# Altium footprint library Selex_PCBLib.PcbLib: 388 footprints (part 23 of 25)
Each footprint in its own frame and in the unit in brackets; x right, y up, seen from the top. Pads: shape width x height; smd on the part's side, far side on the other; paste and mask are expansions set on the pad; w line width, h text height; cw(c..) or ccw(c..) is an arc to the next point about the centre after c.
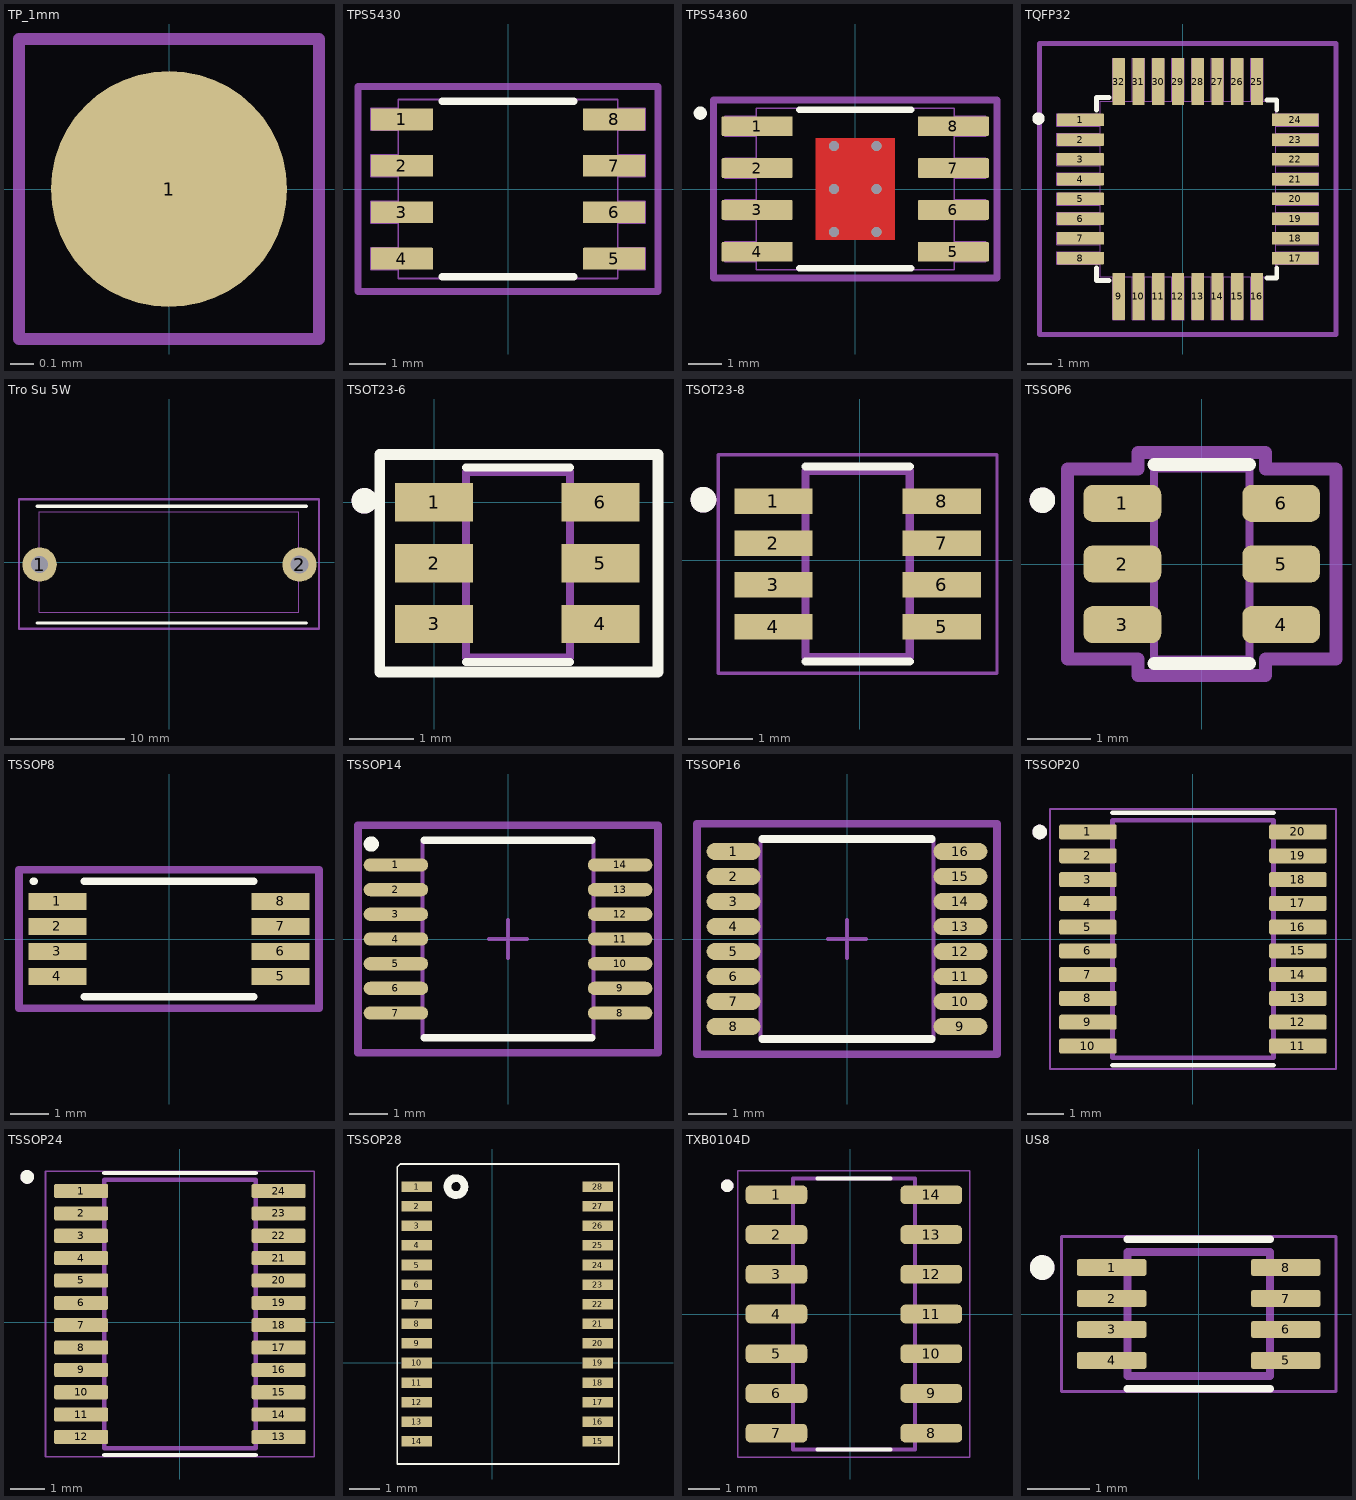
[diagram p22: the footprints below, top view; thin cyan lines are the x and y axes]

## TP_1mm [mm] "Surface"
pads (1):
  round 1 smd: 1(0,0)
Mechanical 15:
  lines w0.05: -0.635,-0.635 -0.635,0.635 0.635,0.635 0.635,-0.635 -0.635,-0.635

## TPS5430 [mm]
pads (8):
  rrect10% 1.7x0.6 smd mask+0.05: 1(-2.9,1.905) 2(-2.9,0.635) 3(-2.9,-0.635) 4(-2.9,-1.905) 5(2.9,-1.905) 6(2.9,-0.635) 7(2.9,0.635) 8(2.9,1.905)
Top Overlay:
  lines w0.2: -1.8,-2.4 1.8,-2.4 ; -1.8,2.4 1.8,2.4
Mechanical 1:
  lines w0.05: -3,-2.205 -3.75,-2.205 -3.75,-1.605 -3,-1.605 ; -3,-0.935 -3.75,-0.935 -3.75,-0.335 -3,-0.335 ; -3,0.335 -3.75,0.335 -3.75,0.935 -3,0.935 ; -3,1.605 -3.75,1.605 -3.75,2.205 -3,2.205 ; 3,-2.205 3.75,-2.205 3.75,-1.605 3,-1.605 ; 3,-0.935 3.75,-0.935 3.75,-0.335 3,-0.335 ; 3,0.335 3.75,0.335 3.75,0.935 3,0.935 ; 3,1.605 3.75,1.605 3.75,2.205 3,2.205 ; -3,-2.45 -3,2.45 3,2.45 3,-2.45 -3,-2.45
Mechanical 15:
  lines w0.2: -4.1,-2.8 4.1,-2.8 4.1,2.8 -4.1,2.8 -4.1,-2.8
3D body "User Library-SOP8_150mil_3_8mm_Body.step": height 1.6, standoff 0, extent -1.95,-2.45 1.95,2.45
3D body: height 0.25, standoff 0, extent -3,2.405 -3,2.405
3D body: height 0.25, standoff 0, extent -0.8,0.605 -0.8,0.605

## TPS54360 [mm] "DC - DC, INPUT: 4.5-60v, OUTPUT: 0.8-58.8v. 3A"
height 1.7
pads (8):
  rrect10% 2.15x0.6 smd mask+0.05: 1(-2.975,1.905) 2(-2.975,0.635) 3(-2.975,-0.635) 4(-2.975,-1.905) 5(2.975,-1.905) 6(2.975,-0.635) 7(2.975,0.635) 8(2.975,1.905)
via 0.65,-1.3 diameter 0.3 hole 0.3
via -0.65,-1.3 diameter 0.3 hole 0.3
via -0.65,0 diameter 0.3 hole 0.3
via -0.65,1.3 diameter 0.3 hole 0.3
via 0.65,1.3 diameter 0.3 hole 0.3
via 0.65,0 diameter 0.3 hole 0.3
Top Layer:
  rectangle: -1.2,-1.55 1.2,1.55
Top Overlay:
  circle w0.2: c-4.7,2.3 r0.1
  lines w0.2: -1.7,-2.4 1.7,-2.4 ; -1.7,2.4 1.7,2.4
Mechanical 1:
  lines w0.05: -3,-2.205 -3.95,-2.205 -3.95,-1.605 -3,-1.605 ; -3,-0.935 -3.95,-0.935 -3.95,-0.335 -3,-0.335 ; -3,0.335 -3.95,0.335 -3.95,0.935 -3,0.935 ; -3,1.605 -3.95,1.605 -3.95,2.205 -3,2.205 ; 3,-2.205 3.95,-2.205 3.95,-1.605 3,-1.605 ; 3,-0.935 3.95,-0.935 3.95,-0.335 3,-0.335 ; 3,0.335 3.95,0.335 3.95,0.935 3,0.935 ; 3,1.605 3.95,1.605 3.95,2.205 3,2.205 ; -3,-2.45 -3,2.45 3,2.45 3,-2.45 -3,-2.45
Mechanical 15:
  lines w0.2: -4.3,-2.7 -4.3,2.7 4.3,2.7 4.3,-2.7 -4.3,-2.7
3D body "User Library-TPS54360DDA.step": height 1.78, standoff 0.19, extent -3.1,-2.5 3.1,2.5

## TQFP32 [mm] "Thin QFP, 32-Leads, Body 9x9mm, Pitch 0.8mm, IPC Low Density"
height 1.6
pads (32):
  rrect10% 1.9x0.5 smd mask+0.05: 1(-4.15,2.8) 2(-4.15,2) 3(-4.15,1.2) 4(-4.15,0.4) 5(-4.15,-0.4) 6(-4.15,-1.2) 7(-4.15,-2) 8(-4.15,-2.8) 17(4.55,-2.8) 18(4.55,-2) 19(4.55,-1.2) 20(4.55,-0.4) 21(4.55,0.4) 22(4.55,1.2) 23(4.55,2) 24(4.55,2.8)
  rrect10% 0.5x1.9 smd mask+0.05: 9(-2.6,-4.35) 10(-1.8,-4.35) 11(-1,-4.35) 12(-0.2,-4.35) 13(0.6,-4.35) 14(1.4,-4.35) 15(2.2,-4.35) 16(3,-4.35) 25(3,4.35) 26(2.2,4.35) 27(1.4,4.35) 28(0.6,4.35) 29(-0.2,4.35) 30(-1,4.35) 31(-1.8,4.35) 32(-2.6,4.35)
Top Overlay:
  circle w0.3: c-5.85,2.85 r0.1
  lines w0.2: -3.5,-3.2 -3.5,-3.7 -3,-3.7 ; -3.5,3.2 -3.5,3.7 -3,3.7 ; 3.4,-3.6 3.8,-3.6 3.8,-3.2 ; 3.4,3.6 3.8,3.6 3.8,3.2
Mechanical 1:
  lines w0.05: -5.1,2.55 -5.1,3.05 ; -5.1,2.55 -3.35,2.55 ; -5.1,2.55 -3.35,2.55 ; -5.1,2.55 -5.1,3.05 ; -5.1,3.05 -3.35,3.05 ; -5.1,3.05 -3.35,3.05 ; -3.35,2.55 -3.35,3.05 ; -3.35,2.55 -3.35,3.05 ; -2.85,-5.3 -2.35,-5.3 ; -2.85,-5.3 -2.85,-3.55 ; -2.85,-5.3 -2.85,-3.55 ; -2.85,-5.3 -2.35,-5.3 ; -2.85,-3.55 -2.35,-3.55 ; -2.85,-3.55 -2.35,-3.55 ; -2.35,-5.3 -2.35,-3.55 ; -2.35,-5.3 -2.35,-3.55 ; 2.75,3.55 2.75,5.3 ; 2.75,3.55 3.25,3.55 ; 2.75,3.55 3.25,3.55 ; 2.75,3.55 2.75,5.3 ; 2.75,5.3 3.25,5.3 ; 2.75,5.3 3.25,5.3 ; 3.25,3.55 3.25,5.3 ; 3.25,3.55 3.25,5.3 ; 3.75,-3.05 3.75,-2.55 ; 3.75,-3.05 5.5,-3.05 ; 3.75,-3.05 5.5,-3.05 ; 3.75,-3.05 3.75,-2.55 ; 3.75,-2.55 5.5,-2.55 ; 3.75,-2.55 5.5,-2.55 ; 5.5,-3.05 5.5,-2.55 ; 5.5,-3.05 5.5,-2.55 ; -5.1,-3.05 -5.1,-2.55 -3.35,-2.55 -3.35,-3.05 -5.1,-3.05 ; -5.1,-2.25 -5.1,-1.75 -3.35,-1.75 -3.35,-2.25 -5.1,-2.25 ; -5.1,-1.45 -5.1,-0.95 -3.35,-0.95 -3.35,-1.45 -5.1,-1.45 ; -5.1,-0.65 -5.1,-0.15 -3.35,-0.15 -3.35,-0.65 -5.1,-0.65 ; -5.1,0.15 -5.1,0.65 -3.35,0.65 -3.35,0.15 -5.1,0.15 ; -5.1,0.95 -5.1,1.45 -3.35,1.45 -3.35,0.95 -5.1,0.95 ; -5.1,1.75 -5.1,2.25 -3.35,2.25 -3.35,1.75 -5.1,1.75 ; -3.35,-3.55 3.75,-3.55 3.75,3.55 -3.35,3.55 -3.35,-3.55 ; -2.85,3.55 -2.35,3.55 -2.35,5.3 -2.85,5.3 -2.85,3.55 ; -2.05,-5.3 -2.05,-3.55 -1.55,-3.55 -1.55,-5.3 -2.05,-5.3 ; -2.05,3.55 -1.55,3.55 -1.55,5.3 -2.05,5.3 -2.05,3.55 ; -1.25,-5.3 -1.25,-3.55 -0.75,-3.55 -0.75,-5.3 -1.25,-5.3 ; -1.25,3.55 -0.75,3.55 -0.75,5.3 -1.25,5.3 -1.25,3.55 ; -0.45,-5.3 -0.45,-3.55 0.05,-3.55 0.05,-5.3 -0.45,-5.3 ; -0.45,3.55 0.05,3.55 0.05,5.3 -0.45,5.3 -0.45,3.55 ; 0.35,-5.3 0.35,-3.55 0.85,-3.55 0.85,-5.3 0.35,-5.3 ; 0.35,3.55 0.85,3.55 0.85,5.3 0.35,5.3 0.35,3.55 ; 1.15,-5.3 1.15,-3.55 1.65,-3.55 1.65,-5.3 1.15,-5.3 ; 1.15,3.55 1.65,3.55 1.65,5.3 1.15,5.3 1.15,3.55 ; 1.95,-5.3 1.95,-3.55 2.45,-3.55 2.45,-5.3 1.95,-5.3 ; 1.95,3.55 2.45,3.55 2.45,5.3 1.95,5.3 1.95,3.55 ; 2.75,-5.3 2.75,-3.55 3.25,-3.55 3.25,-5.3 2.75,-5.3 ; 3.75,-2.25 5.5,-2.25 5.5,-1.75 3.75,-1.75 3.75,-2.25 ; 3.75,-1.45 5.5,-1.45 5.5,-0.95 3.75,-0.95 3.75,-1.45 ; 3.75,-0.65 5.5,-0.65 5.5,-0.15 3.75,-0.15 3.75,-0.65 ; 3.75,0.15 5.5,0.15 5.5,0.65 3.75,0.65 3.75,0.15 ; 3.75,0.95 5.5,0.95 5.5,1.45 3.75,1.45 3.75,0.95 ; 3.75,1.75 5.5,1.75 5.5,2.25 3.75,2.25 3.75,1.75 ; 3.75,2.55 5.5,2.55 5.5,3.05 3.75,3.05 3.75,2.55
Mechanical 15:
  lines w0.2: -5.8,-5.9 6.2,-5.9 6.2,5.9 -5.8,5.9 -5.8,-5.9
3D body "User Library-SW3dPS-atmega8 (tqfp32)_V2008.step": height 1.1, standoff -0.01, extent -4.6,-4.85 5,4.75

## Tro Su 5W [mm]
pads (2):
  round 3 hole 1.5 mask+0.1: 1(-11.3,-0.2)
  round 3 hole 1.6 mask+0.1: 2(11.4,-0.2)
Top Overlay:
  lines w0.3: -11.5,-5.3 12,-5.3 ; -11.5,4.9 12,4.9
Mechanical 1:
  lines w0.05: -11.35,-4.38 11.35,-4.38 11.35,4.42 -11.35,4.42 -11.35,-4.38
Mechanical 15:
  lines w0.2: -13.1,-5.8 -13.1,5.5 13.1,5.5 13.1,-5.8 -2.4,-5.8 -13.1,-5.8
3D body "696107003002.STEP": height 14, standoff -3, extent -12.2,-4.88 12.2,4.52

## TSOT23-6 [mm]
pads (6):
  rect 1.22x0.6 smd: 1(0,0) 2(0,-0.95) 3(0,-1.9) 4(2.6,-1.9) 5(2.6,-0.95) 6(2.6,0)
Top Overlay:
  circle w0.2: c-1.09,0.025 r0.1
  lines w0.127: 0.497,-2.495 2.123,-2.495 ; 0.497,0.545 2.123,0.545
  lines w0.167: -0.85,-2.65 -0.85,0.75 3.5,0.75 3.5,-2.65 -0.85,-2.65
Mechanical 13:
  circle w0.2: c-1.09,0.025 r0.1
  lines w0.127: 0.497,-2.425 0.497,0.475 2.123,0.475 2.123,-2.425 0.497,-2.425
Mechanical 15:
  lines w0.05: -0.86,-2.675 3.48,-2.675 3.48,0.725 -0.86,0.725 -0.86,-2.675
3D body "User Library-TSOT-23-6(S6).STEP": height 1, standoff 0, extent -0.062,-2.45 2.762,0.45

## TSOT23-8 [mm]
pads (8):
  rect 1.22x0.4 smd: 1(-1.343,0.918) 2(-1.343,0.268) 3(-1.343,-0.382) 4(-1.343,-1.032) 5(1.277,-1.032) 6(1.277,-0.382) 7(1.277,0.268) 8(1.277,0.918)
Top Overlay:
  circle w0.2: c-2.433,0.943 r0.1
  lines w0.127: -0.845,-1.577 0.78,-1.577 ; -0.845,1.463 0.78,1.463
Mechanical 13:
  circle w0.2: c-2.433,0.943 r0.1
  lines w0.127: -0.845,-1.507 0.78,-1.507 0.78,1.393 -0.845,1.393 -0.845,-1.507
Mechanical 15:
  lines w0.05: -2.203,-1.757 -2.203,1.643 2.137,1.643 2.137,-1.757 -2.203,-1.757

## TSSOP6 [mm] "TSSOP_6_0P95_2P65"
pads (6):
  rrect50% 1.22x0.58 smd: 1(-1.245,0.95) 2(-1.245,0) 3(-1.245,-0.95) 4(1.245,-0.95) 5(1.245,0) 6(1.245,0.95)
Top Overlay:
  circle w0.2: c-2.5,1 r0.1
  lines w0.2: -0.75,-1.56 0.75,-1.56 ; -0.75,1.56 0.75,1.56
Mechanical 13:
  circle w0.2: c-2.5,1 r0.1
  lines w0.127: -0.75,-1.5 -0.75,1.5 0.75,1.5 0.75,-1.5 -0.75,-1.5
Mechanical 15:
  lines w0.2: -2.105,-1.49 -1,-1.49 -1,-1.75 1,-1.75 1,-1.49 2.105,-1.49 2.105,1.49 1,1.49 1,1.75 -1,1.75 -1,1.49 -2.105,1.49 -2.105,-1.49
3D body "NUP4114HMR6T1G.STEP": height 1.1, standoff 0, extent -1.375,-1.5 1.375,1.5

## TSSOP8 [mm] "TSSOP_8_0p65_5p8"
pads (8):
  rect 1.5x0.45 smd paste+0.1: 1(-2.9,0.975) 2(-2.9,0.325) 3(-2.9,-0.325) 4(-2.9,-0.975) 5(2.9,-0.975) 6(2.9,-0.325) 7(2.9,0.325) 8(2.9,0.975)
Top Overlay:
  lines w0.2: -3.525,1.5 -3.5,1.5 ; -2.2,-1.5 2.2,-1.5 ; -2.2,1.5 2.2,1.5
Mechanical 15:
  lines w0.2: -3.9,-1.8 -3.9,1.8 -0.5,1.8 3.9,1.8 3.9,-1.8 -3.9,-1.8
3D body "User Library-TSS0P8.STEP": height 1.09, standoff 0, extent -3.14,-1.525 3.14,1.475

## TSSOP14 [mm] "TSSOP_14_0p65x5p9"
pads (14):
  oval 1.7x0.35 smd: 1(-2.952,1.95) 2(-2.952,1.3) 3(-2.952,0.65) 4(-2.952,0) 5(-2.952,-0.65) 6(-2.952,-1.3) 7(-2.952,-1.95) 8(2.952,-1.95) 9(2.952,-1.3) 10(2.952,-0.65) 11(2.952,0) 12(2.952,0.65) 13(2.952,1.3) 14(2.952,1.95)
Top Overlay:
  circle w0.2: c-3.6,2.5 r0.1
  lines w0.2: -2.2,-2.6 2.2,-2.6 ; -2.2,2.6 2.2,2.6
Mechanical 13:
  lines w0.1: -2.25,-2.55 -2.25,2.55 2.25,2.55 2.25,-2.55 -2.25,-2.55
Mechanical 15:
  lines w0.1: -0.5,0 0.5,0 ; 0,-0.5 0,0.5
  lines w0.2: -3.95,-3 -3.95,3 3.95,3 3.95,-3 -3.95,-3
3D body "PW14.stp": height 1.2, standoff 0, extent -3.302,-2.553 3.302,2.553

## TSSOP16 [mm] "TSSOP_16_0P65_6P0"
pads (16):
  oval 1.4x0.45 smd: 1(-2.95,2.275) 2(-2.95,1.625) 3(-2.95,0.975) 4(-2.95,0.325) 5(-2.95,-0.325) 6(-2.95,-0.975) 7(-2.95,-1.625) 8(-2.95,-2.275) 9(2.95,-2.275) 10(2.95,-1.625) 11(2.95,-0.975) 12(2.95,-0.325) 13(2.95,0.325) 14(2.95,0.975) 15(2.95,1.625) 16(2.95,2.275)
Top Overlay:
  lines w0.2: -2.2,-2.6 2.2,-2.6 ; -2.2,2.6 2.2,2.6
Mechanical 13:
  lines w0.1: -2.25,-2.55 -2.25,2.55 2.25,2.55 2.25,-2.55 -2.25,-2.55
Mechanical 15:
  lines w0.1: -0.5,0 0.5,0 ; 0,-0.5 0,0.5
  lines w0.2: -3.9,-3 -3.9,3 3.9,3 3.9,-3 -3.9,-3
3D body "User Library-TSSOP-16-1.STEP": height 1.1, standoff 0, extent -3.2,-2.5 3.2,2.5

## TSSOP20 [mm]
pads (20):
  rrect25% 1.57x0.41 smd: 1(-2.87,2.925) 2(-2.87,2.275) 3(-2.87,1.625) 4(-2.87,0.975) 5(-2.87,0.325) 6(-2.87,-0.325) 7(-2.87,-0.975) 8(-2.87,-1.625) 9(-2.87,-2.275) 10(-2.87,-2.925) 11(2.87,-2.925) 12(2.87,-2.275) 13(2.87,-1.625) 14(2.87,-0.975) 15(2.87,-0.325) 16(2.87,0.325) 17(2.87,0.975) 18(2.87,1.625) 19(2.87,2.275) 20(2.87,2.925)
Top Overlay:
  circle w0.2: c-4.19,2.925 r0.1
  lines w0.127: -2.2,-3.45 2.2,-3.45 ; -2.2,3.45 2.2,3.45
Mechanical 13:
  circle w0.2: c-4.19,2.925 r0.1
  lines w0.127: -2.2,-3.25 -2.2,3.25 2.2,3.25 2.2,-3.25 -2.2,-3.25
Mechanical 15:
  lines w0.05: -3.91,-3.55 -3.91,3.55 3.91,3.55 3.91,-3.55 -3.91,-3.55
3D body "stm8s003f3p6.stp": height 1.1, standoff 0, extent -3.15,-3.3 3.25,3.2

## TSSOP24 [mm]
pads (24):
  rrect25% 1.57x0.41 smd: 1(-2.858,3.812) 2(-2.858,3.162) 3(-2.858,2.512) 4(-2.858,1.862) 5(-2.858,1.212) 6(-2.858,0.562) 7(-2.858,-0.088) 8(-2.858,-0.738) 9(-2.858,-1.388) 10(-2.858,-2.038) 11(-2.858,-2.688) 12(-2.858,-3.338) 13(2.882,-3.338) 14(2.882,-2.688) 15(2.882,-2.038) 16(2.882,-1.388) 17(2.882,-0.738) 18(2.882,-0.088) 19(2.882,0.562) 20(2.882,1.212) 21(2.882,1.862) 22(2.882,2.512) 23(2.882,3.162) 24(2.882,3.812)
Top Overlay:
  circle w0.2: c-4.428,4.222 r0.1
  lines w0.127: -2.188,-3.863 2.212,-3.863 ; -2.188,4.337 2.212,4.337
Mechanical 13:
  circle w0.2: c-4.428,4.222 r0.1
  lines w0.127: -2.188,-3.663 -2.188,4.137 2.212,4.137 2.212,-3.663 -2.188,-3.663
Mechanical 15:
  lines w0.05: -3.893,-3.913 -3.893,4.387 3.917,4.387 3.917,-3.913 -3.893,-3.913
3D body "step_temp.STEP": height 1.2, standoff 0, extent -3.315,-3.663 3.085,4.137

## TSSOP28 [mm] "TSSOP_8_0p65_5p8"
pads (28):
  rect 1x0.35 smd paste+0.1: 1(-2.5,5.85) 2(-2.5,5.2) 3(-2.5,4.55) 4(-2.5,3.9) 5(-2.5,3.25) 6(-2.5,2.6) 7(-2.5,1.95) 8(-2.5,1.3) 9(-2.5,0.65) 10(-2.5,0) 11(-2.5,-0.65) 12(-2.5,-1.3) 13(-2.5,-1.95) 14(-2.5,-2.6) 15(3.5,-2.6) 16(3.5,-1.95) 17(3.5,-1.3) 18(3.5,-0.65) 19(3.5,0) 20(3.5,0.65) 21(3.5,1.3) 22(3.5,1.95) 23(3.5,2.6) 24(3.5,3.25) 25(3.5,3.9) 26(3.5,4.55) 27(3.5,5.2) 28(3.5,5.85)
Top Overlay:
  circle w0.254: c-1.2,5.85 r0.281
  lines w0.05: -3.15,-3.35 -3.15,6.5 -3.05,6.6 -2.8,6.6 4.2,6.6 4.2,-3.35 -3.15,-3.35
3D body "User Library-TSSOP-28_P065.STEP": height 1.02, standoff 0.03, extent -2.75,-3.2 3.65,6.5

## TXB0104D [mm] "TXB0104D"
pads (14):
  rrect50% 1.97x0.6 smd: 1(-2.356,3.815) 2(-2.356,2.545) 3(-2.356,1.275) 4(-2.356,0.005) 5(-2.356,-1.265) 6(-2.356,-2.535) 7(-2.356,-3.805) 8(2.594,-3.805) 9(2.594,-2.535) 10(2.594,-1.265) 11(2.594,0.005) 12(2.594,1.275) 13(2.594,2.545) 14(2.594,3.815)
Top Overlay:
  circle w0.2: c-3.931,4.105 r0.1
  lines w0.127: -1.051,-4.32 1.289,-4.32 ; -1.051,4.33 1.289,4.33
Mechanical 13:
  circle w0.2: c-3.931,4.105 r0.1
  lines w0.127: -1.831,-4.32 2.069,-4.32 2.069,4.33 -1.831,4.33 -1.831,-4.32
Mechanical 15:
  lines w0.05: -3.591,-4.57 3.829,-4.57 3.829,4.58 -3.591,4.58 -3.591,-4.57
3D body "TXB0104D.STEP": height 1.75, standoff 0, extent -2.881,-4.32 3.119,4.33

## US8 [mm]
pads (8):
  rrect25% 1.12x0.27 smd: 1(-1.405,0.75) 2(-1.405,0.25) 3(-1.405,-0.25) 4(-1.405,-0.75) 5(1.405,-0.75) 6(1.405,-0.25) 7(1.405,0.25) 8(1.405,0.75)
Top Overlay:
  circle w0.2: c-2.525,0.75 r0.1
  lines w0.127: -1.15,-1.205 1.15,-1.205 ; -1.15,1.205 1.15,1.205
Mechanical 13:
  circle w0.2: c-2.525,0.75 r0.1
  lines w0.127: -1.15,-1 1.15,-1 1.15,1 -1.15,1 -1.15,-1
Mechanical 15:
  lines w0.05: -2.215,-1.25 2.215,-1.25 2.215,1.25 -2.215,1.25 -2.215,-1.25
3D body "step_temp.STEP": height 0.9, standoff 0, extent -1.55,-1 1.55,1